# Altium footprint library ESKDPcbLib.PcbLib: 608 footprints (part 8 of 38)
Each footprint in its own frame and in the unit in brackets; x right, y up, seen from the top. Pads: shape width x height; smd on the part's side, far side on the other; paste and mask are expansions set on the pad; w line width, h text height; cw(c..) or ccw(c..) is an arc to the next point about the centre after c.
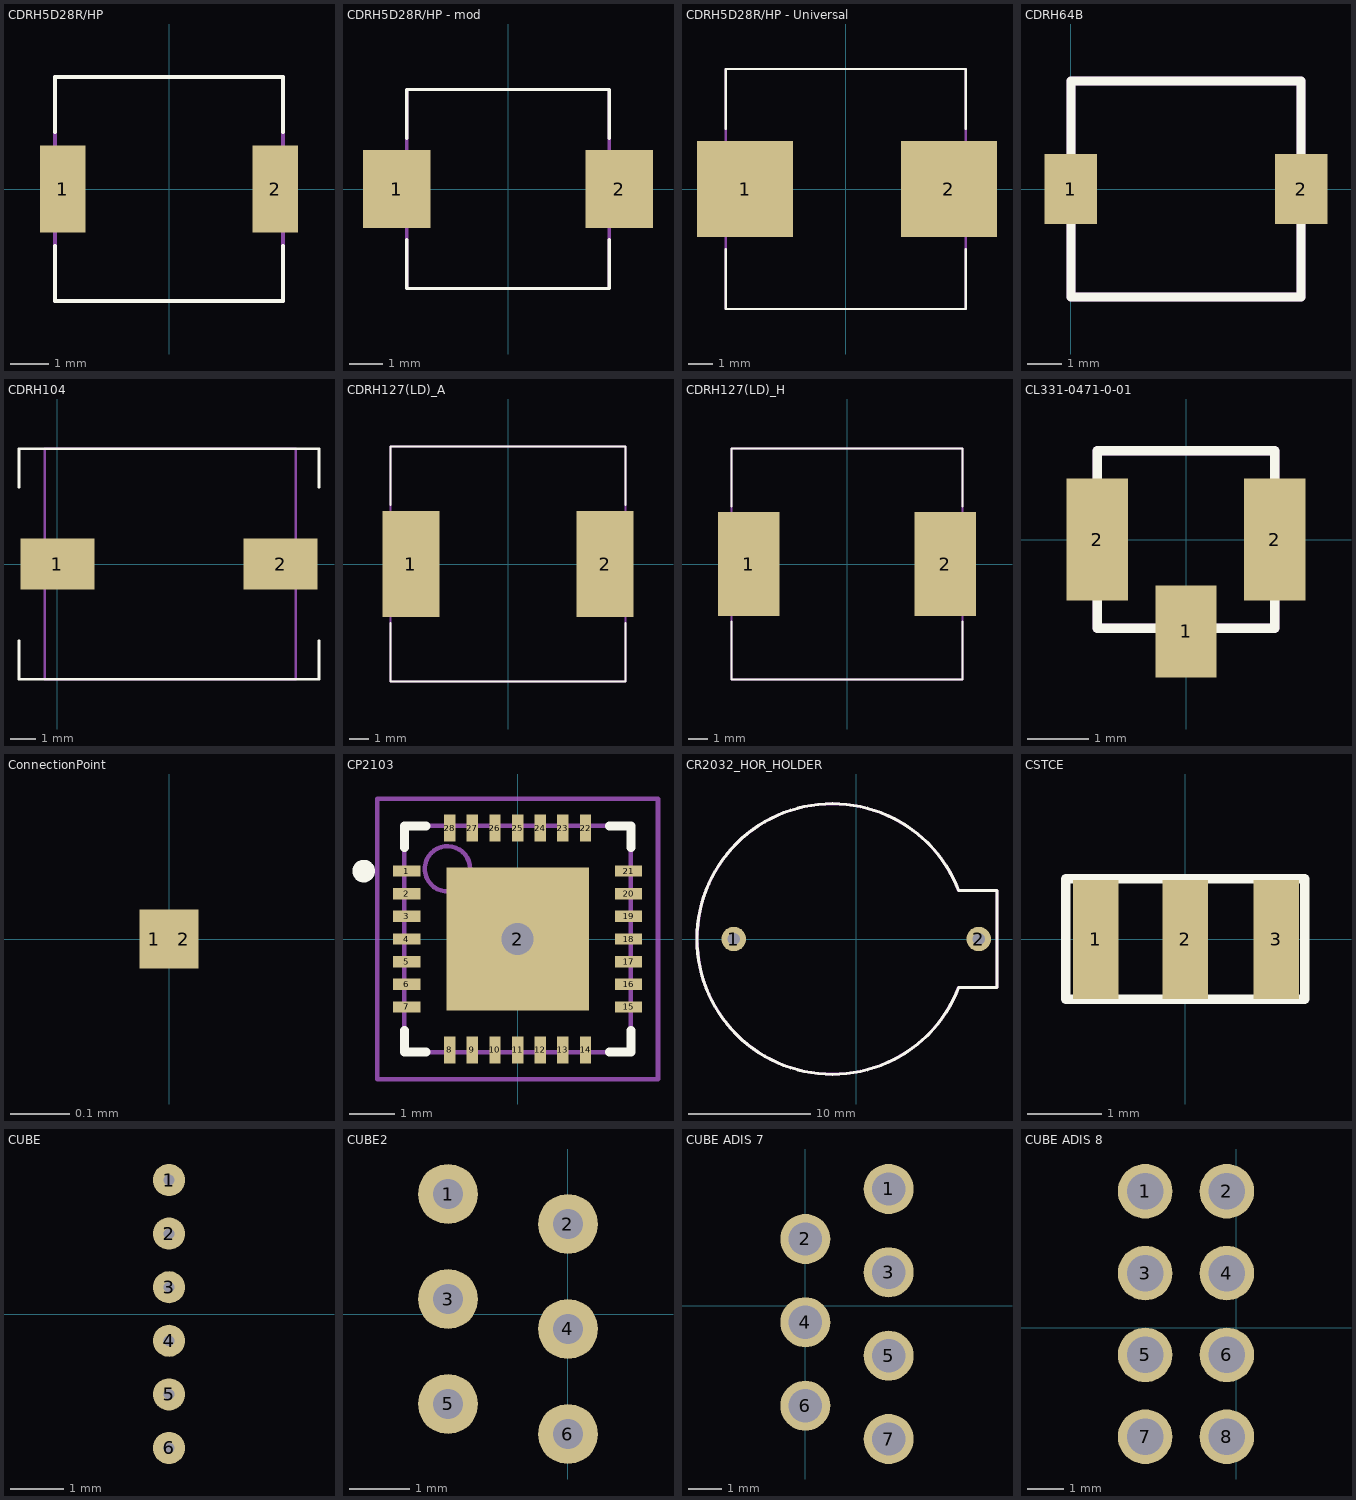
[diagram p7: the footprints below, top view; thin cyan lines are the x and y axes]

## CDRH5D28R/HP [mm]
height 2.8
pads (2):
  rect 1.2x2.3 smd mask+0: 1(-2.8,0) 2(2.8,0)
Top Overlay:
  lines w0.1: -3,-1.5 -3,-2.95 3,-2.95 3,-1.5 ; -3,1.5 -3,2.95 3,2.95 3,1.5
Mechanical 7:
  lines w0.1: -3,-2.95 -3,1.5 -3,2.95 3,2.95 3,1.5 3,-2.95 -3,-2.95
Mechanical 10:
  text ".Comment" at -2.8,-3.5 h0.6
  text ".Designator" at -3,3.25 h0.8
3D body: height 2.8, standoff 0, extent -3,-3 3,3

## CDRH5D28R/HP - mod [mm]
height 2.8
pads (2):
  rect 2x2.3 smd mask+0: 1(-3.3,0) 2(3.3,0)
Top Overlay:
  lines w0.1: -3,-1.5 -3,-2.95 3,-2.95 3,-1.5 ; -3,1.5 -3,2.95 3,2.95 3,1.5
Mechanical 7:
  lines w0.1: -3,-2.95 -3,1.5 -3,2.95 3,2.95 3,1.5 3,-2.95 -3,-2.95
Mechanical 10:
  text ".Comment" at -2.8,-3.5 h0.6
  text ".Designator" at -3,3.25 h0.8
3D body: height 2.73, standoff -0.03, extent -3.035,-3 3.035,3

## CDRH5D28R/HP - Universal [mm]
height 2.8
pads (2):
  rect 4x4 smd mask+0: 1(-4.2,0) 2(4.3,0)
Top Overlay:
  lines w0.1: -5,-2.5 -5,-5 5,-5 5,-2.5 ; -5,2.5 -5,5 5,5 5,2.5
Mechanical 7:
  lines w0.1: -5,-5 5,-5 5,-0.5 5,5 -5,5 -5,3.5 -5,-5
Mechanical 10:
  text ".Designator" at -3,3.25 h0.8
  text ".Comment" at -2.8,-3.5 h0.6
3D body: height 2.73, standoff -0.03, extent -3.035,-3 3.035,3

## CDRH64B [mm]
pads (2):
  rect 1.5x2 smd mask+0: 1(0,0) 2(6.6,0)
Top Overlay:
  lines w0.254: 0,-3.1 0,3.1 6.6,3.1 6.6,-3.1 0,-3.1
Mechanical 7:
  lines w0.254: 0,-3.1 0,3.1 6.6,3.1 6.6,-3.1 0,-3.1
Mechanical 10:
  text ".Designator" at -0.75,3.75 h0.8
  text ".Comment" at 4.25,-3.5 h0.6
3D body: height 5, standoff 0, extent 0,-3.1 6.6,3.1

## CDRH104 [mm]
pads (2):
  rect 2.9x2 smd mask+0: 1(0,0) 2(8.7,0)
Top Overlay:
  lines w0.1: -1.5,-3 -1.5,-4.5 10.2,-4.5 10.2,-3 ; -1.5,3 -1.5,4.5 10.2,4.5 10.2,3
Mechanical 7:
  lines w0.1: -0.5,-4.5 9.3,-4.5 9.3,0.15 9.3,4.5 -0.5,4.5 -0.5,-4.5
Mechanical 10:
  text ".Designator" at 4.95,7 h0.8
  text ".Comment" at 2.95,-7 h0.6
3D body: height 5, standoff 0, extent -0.55,-4.45 9.25,4.45

## CDRH127(LD)_A [mm]
height 8
pads (2):
  rect 2.9x5.4 smd mask+0: 1(-4.95,0) 2(4.95,0)
Top Overlay:
  lines w0.1: -6,-3 -6,-6 6,-6 6,-3 ; -6,3 -6,6 6,6 6,3
Mechanical 7:
  lines w0.1: -6,-6 6,-6 6,-1.5 6,6 -6,6 -6,4.5 -6,-6
Mechanical 10:
  text ".Designator" at 0,7 h0.8
  text ".Comment" at -2,-7 h0.6
3D body: height 2.8, standoff 0, extent -6,-6 6,6

## CDRH127(LD)_H [mm]
height 8
pads (2):
  rect 3.2x5.4 smd mask+0: 1(-5.1,0) 2(5.1,0)
Top Overlay:
  lines w0.1: -6,-3 -6,-6 6,-6 6,-3 ; -6,3 -6,6 6,6 6,3
Mechanical 7:
  lines w0.1: -6,-6 6,-6 6,-1.5 6,6 -6,6 -6,4.5 -6,-6
Mechanical 10:
  text ".Designator" at 0,7 h0.8
  text ".Comment" at -2,-7 h0.6
3D body: height 2.8, standoff 0, extent -6,-6 6,6

## CL331-0471-0-01 [mm]
pads (3):
  rect 1x1.5 smd mask+0: 1(0,-1.5)
  rect 1x2 smd mask+0: 2(-1.45,0) 2(1.45,0)
Top Overlay:
  lines w0.15: -0.5,-1.45 -1.45,-1.45 -1.45,1.45 1.45,1.45 1.45,-1.45 0.5,-1.45
Mechanical 7:
  lines w0.15: -0.5,-1.45 -1.45,-1.45 -1.45,1.45 1.45,1.45 1.45,-1.45 0.5,-1.45
3D body: height 1.3, standoff -0.05, extent -1.45,-1.45 1.45,1.45

## ConnectionPoint [mm]
pads (2):
  rect 0.05x0.1 smd paste+0 mask-0.1: 1(-0.025,0) 2(0.025,0)

## CP2103 [mm] "QFN, 28-Leads, Body 5,0x5,0mm (max), Pitch 0,50mm, IPC Medium Density"
height 1
pads (29):
  rect 0.6x0.25 smd: 1(-2.45,1.5) 2(-2.45,1) 3(-2.45,0.5) 4(-2.45,0) 5(-2.45,-0.5) 6(-2.45,-1) 7(-2.45,-1.5) 15(2.45,-1.5) 16(2.45,-1) 17(2.45,-0.5) 18(2.45,0) 19(2.45,0.5) 20(2.45,1) 21(2.45,1.5)
  rect 3.15x3.15 smd: 2(0,0)
  rect 0.25x0.6 smd: 8(-1.5,-2.45) 9(-1,-2.45) 10(-0.5,-2.45) 11(0,-2.45) 12(0.5,-2.45) 13(1,-2.45) 14(1.5,-2.45) 22(1.5,2.45) 23(1,2.45) 24(0.5,2.45) 25(0,2.45) 26(-0.5,2.45) 27(-1,2.45) 28(-1.5,2.45)
via 0,0 diameter 1.27 hole 0.711
Top Overlay:
  circle w0.25: c-3.4,1.5 r0.125
  lines w0.2: -2.5,-2.025 -2.5,-2.5 -2.025,-2.5 ; -2.5,2.025 -2.5,2.5 -2.025,2.5 ; 2.025,-2.5 2.5,-2.5 2.5,-2.025 ; 2.025,2.5 2.5,2.5 2.5,2.025
Mechanical 9:
  circle w0.1: c-1.55,1.55 r0.5
  lines w0.1: -2.5,-2.5 2.5,-2.5 2.5,2.5 -2.5,2.5 -2.5,-2.5
Mechanical 15:
  lines w0.1: -0.5,0 0.5,0 ; 0,-0.5 0,0.5 ; -3.1,-3.1 3.1,-3.1 3.1,3.1 -3.1,3.1 -3.1,-3.1
3D body: height 1, standoff 0.11, extent -2.5,-2.5 2.5,2.5

## CR2032_HOR_HOLDER [mm]
pads (2):
  round 2 hole 1: 1(-10,0) 2(10,0)
Top Overlay:
  lines w0.254: 8.375,-3.95 cw(c-1.95,0) 8.375,3.95 11.5,3.95 11.5,-3.95 8.375,-3.95
Mechanical 7:
  lines w0.254: 8.371,-3.948 cw(c-1.95,0) 8.371,3.948 ; 8.375,-3.95 11.5,-3.95 11.5,3.95 8.375,3.95
Mechanical 10:
  text ".Designator" at -0.595,12.47 h1
  text ".Comment" at -0.595,11.47 h1
3D body "CR2032_HOR_HOLD.STEP": height 8.5, standoff -4, extent -13.4,-11 11.1,11

## CSTCE [mil]
pads (3):
  rect 24x63 smd: 1(-47.24,0) 2(0,0) 3(48,0)
Top Overlay:
  lines w5: -62.99,-31.5 -62.99,32 63,32 63,-31.5 -62.99,-31.5

## CUBE [mm]
pads (6):
  round 0.6 hole 0.2: 1(-4,2.5) 2(-4,1.5) 3(-4,0.5) 4(-4,-0.5) 5(-4,-1.5) 6(-4,-2.5)

## CUBE2 [mm]
pads (6):
  round 1 hole 0.5: 1(-2,2) 2(0,1.5) 3(-2,0.25) 4(0,-0.25) 5(-2,-1.5) 6(0,-2)

## CUBE ADIS 7 [mm]
pads (7):
  round 1.5 hole 1: 1(2.5,3.5) 2(0,2) 3(2.5,1) 4(0,-0.5) 5(2.5,-1.5) 6(0,-3) 7(2.5,-4)

## CUBE ADIS 8 [mm]
pads (8):
  round 1.5 hole 1: 1(-2.5,3.75) 2(-0.25,3.75) 3(-2.5,1.5) 4(-0.25,1.5) 5(-2.5,-0.75) 6(-0.25,-0.75) 7(-2.5,-3) 8(-0.25,-3)